# Altium footprint library _components.PcbLib: 53 footprints (part 3 of 4)
Each footprint in its own frame and in the unit in brackets; x right, y up, seen from the top. Pads: shape width x height; smd on the part's side, far side on the other; paste and mask are expansions set on the pad; w line width, h text height; cw(c..) or ccw(c..) is an arc to the next point about the centre after c.
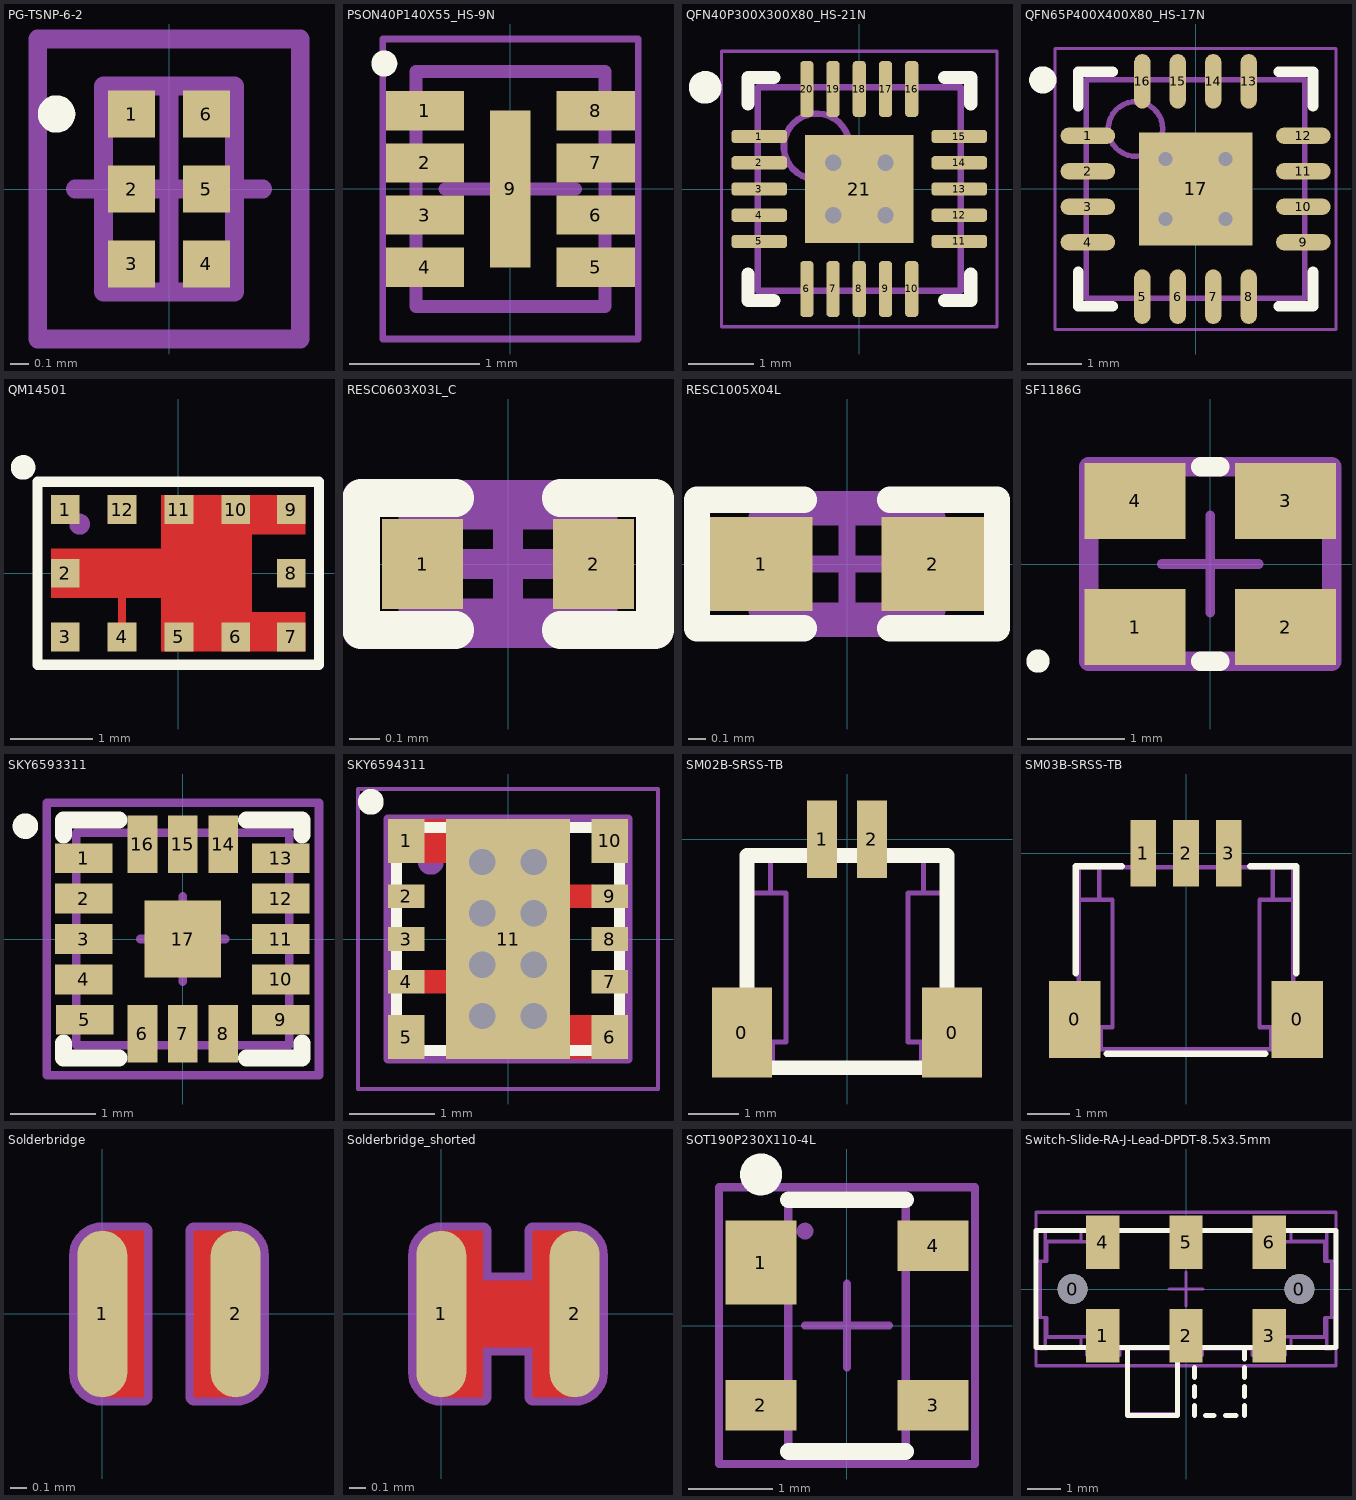
[diagram p2: the footprints below, top view; thin cyan lines are the x and y axes]

## PG-TSNP-6-2 [mm] "TSNP-6-2 ,0.40mm Pitch, 6 Pin, 0.7mm W X 1.1mm L X 0.4mm H body"
height 0.4
pads (6):
  rect 0.25x0.25 smd: 1(-0.2,0.4) 2(-0.2,0) 3(-0.2,-0.4) 4(0.2,-0.4) 5(0.2,0) 6(0.2,0.4)
Top Overlay:
  circle w0.1: c-0.6,0.4 r0.05
Top Assembly Info:
  lines w0.1: -0.35,-0.55 0.35,-0.55 0.35,0.55 -0.35,0.55 -0.35,-0.55
Top Placement:
  lines w0.1: -0.5,0 0.5,0 ; 0,-0.5 0,0.5 ; -0.7,-0.8 0.7,-0.8 0.7,0.8 -0.7,0.8 -0.7,-0.8
3D body "PG-TSNP-6-2_C66065-A0004-C013-04-0004.stp": height 0.4, standoff 0, extent -0.35,-0.55 0.35,0.55

## PSON40P140X55_HS-9N [mm] "PSON, 8-Leads, Body 1,70x1,35mm, Pitch 0,40mm, Thermal Pad 1,20x0,31mm, IPC Medium Density"
height 0.55
pads (9):
  rect 0.6x0.3 smd: 1(-0.655,0.6) 2(-0.655,0.2) 3(-0.655,-0.2) 4(-0.655,-0.6) 5(0.655,-0.6) 6(0.655,-0.2) 7(0.655,0.2) 8(0.655,0.6)
  rect 0.31x1.2 smd: 9(0,0)
Top Overlay:
  circle w0.1: c-0.967,0.962 r0.05
Top Assembly Info:
  lines w0.1: -0.725,-0.9 0.725,-0.9 0.725,0.9 -0.725,0.9 -0.725,-0.9
  text ".Designator" at -0.381,-0.254 h0.5
Top Placement:
  lines w0.05: -0.98,-1.15 -0.98,1.15 0.98,1.15 0.98,-1.15 -0.98,-1.15
  lines w0.1: -0.5,0 0.5,0 ; 0,-0.5 0,0.5
3D body "PSON40P140X55_HS-9N.step": height 0.55, standoff 0, extent -0.726,-0.9 0.726,0.9

## QFN40P300X300X80_HS-21N [mm] "QFN, 20-Leads, Body 3,00x3,00mm, Pitch 0,40mm, Thermal Pad 1,65x1,65mm, IPC Medium Density"
height 0.8
pads (21):
  rrect50% 0.85x0.2 smd: 1(-1.525,0.8) 2(-1.525,0.4) 3(-1.525,0) 4(-1.525,-0.4) 5(-1.525,-0.8) 11(1.525,-0.8) 12(1.525,-0.4) 13(1.525,0) 14(1.525,0.4) 15(1.525,0.8)
  rrect50% 0.2x0.85 smd: 6(-0.8,-1.525) 7(-0.4,-1.525) 8(0,-1.525) 9(0.4,-1.525) 10(0.8,-1.525) 16(0.8,1.525) 17(0.4,1.525) 18(0,1.525) 19(-0.4,1.525) 20(-0.8,1.525)
  rect 1.65x1.65 smd: 21(0,0)
via -0.4,0.4 diameter 0.5 hole 0.25
via 0.4,0.4 diameter 0.5 hole 0.25
via 0.4,-0.4 diameter 0.5 hole 0.25
via -0.4,-0.4 diameter 0.5 hole 0.25
Top Overlay:
  circle w0.25: c-2.35,1.55 r0.125
  lines w0.2: -1.7,-1.3 -1.7,-1.7 -1.3,-1.7 ; -1.7,1.3 -1.7,1.7 -1.3,1.7 ; 1.3,-1.7 1.7,-1.7 1.7,-1.3 ; 1.3,1.7 1.7,1.7 1.7,1.3
Top Assembly Info:
  circle w0.1: c-0.65,0.65 r0.5
  lines w0.1: -1.55,-1.55 -1.55,1.55 1.55,1.55 1.55,-1.55 -1.55,-1.55
  text ".Designator" at -0.275,-0.175 h0.38
Top Placement:
  lines w0.05: -2.1,-2.1 -2.1,2.1 2.1,2.1 2.1,-2.1 -2.1,-2.1
  lines w0.1: -0.5,0 0.5,0 ; 0,-0.5 0,0.5
3D body "QFN40P300X300X80_HS-21N.step": height 0.8, standoff 0, extent -1.551,-1.551 1.551,1.551

## QFN65P400X400X80_HS-17N [mm] "QFN, 16-Leads, Body 4,00x4,00mm, Pitch 0,65mm, Thermal Pad 2,08x2,08mm, IPC Medium Density"
height 0.8
pads (17):
  oval 1x0.3 smd: 1(-1.975,0.975) 2(-1.975,0.325) 3(-1.975,-0.325) 4(-1.975,-0.975) 9(1.975,-0.975) 10(1.975,-0.325) 11(1.975,0.325) 12(1.975,0.975)
  oval 0.3x1 smd: 5(-0.975,-1.975) 6(-0.325,-1.975) 7(0.325,-1.975) 8(0.975,-1.975) 13(0.975,1.975) 14(0.325,1.975) 15(-0.325,1.975) 16(-0.975,1.975)
  rect 2.08x2.08 smd: 17(0,0)
via -0.55,0.55 diameter 0.5 hole 0.25
via 0.55,0.55 diameter 0.5 hole 0.25
via -0.55,-0.55 diameter 0.5 hole 0.25
via 0.55,-0.55 diameter 0.5 hole 0.25
Top Overlay:
  circle w0.25: c-2.8,2 r0.125
  lines w0.2: -2.15,-1.525 -2.15,-2.15 -1.525,-2.15 ; -2.15,1.525 -2.15,2.15 -1.525,2.15 ; 1.525,-2.15 2.15,-2.15 2.15,-1.525 ; 1.525,2.15 2.15,2.15 2.15,1.525
Top Assembly Info:
  circle w0.1: c-1.1,1.1 r0.5
  lines w0.1: -2,-2 -2,2 2,2 2,-2 -2,-2
Top Placement:
  lines w0.05: -2.575,-2.575 -2.575,2.575 2.575,2.575 2.575,-2.575 -2.575,-2.575
  lines w0.1: -0.5,0 0.5,0 ; 0,-0.5 0,0.5
3D body "QFN65P400X400X80_HS-17N.step": height 0.8, standoff 0, extent -2.001,-2.001 2.001,2.001

## QM14501 [mm]
pads (12):
  rect 0.35x0.35 smd mask+0.065: 1(-1.375,0.775) 2(-1.375,0) 3(-1.375,-0.775) 4(-0.683,-0.775) 5(0.009,-0.775) 6(0.701,-0.775) 7(1.375,-0.775) 8(1.375,0) 9(1.375,0.775) 10(0.701,0.775) 11(0.009,0.775) 12(-0.683,0.775)
Top Layer:
  rectangle: -0.208,-0.6 0.9,0.6
  rectangle: -0.208,0.474 1.55,0.95
  rectangle: -0.733,-0.775 -0.633,-0.15
  rectangle: -1.551,-0.3 -0.151,0.3
  rectangle: -0.208,-0.95 1.55,-0.474
Top Overlay:
  circle w0.2: c-1.888,1.288 r0.05
  lines w0.125: -1.713,-1.112 -1.713,1.112 1.712,1.112 1.712,-1.112 -1.713,-1.112
Top Solder:
  rectangle: -0.273,0.365 1.615,1.015
  rectangle: -0.798,-0.775 -0.568,-0.3
  rectangle: -1.615,-0.366 0.965,0.364
  rectangle: -0.273,-1.015 1.615,-0.365
  rectangle: -0.272,-0.6 0.966,0.6
Top Component Info:
  text ".Comment" at -0.9,-0.15 h0.3
Top Assembly Info:
  circle w0.15: c-1.2,0.6 r0.05
  lines w0.01: -1.7,-1.1 1.7,-1.1 1.7,1.1 -1.7,1.1 -1.7,-1.1
  text ".Designator" at -0.45,-0.15 h0.3
Top Placement:
  circle w0.15: c-1.2,0.595 r0.05
  lines w0.01: -1.7,-1.1 1.7,-1.1 1.7,1.1 -1.7,1.1 -1.7,-1.1
3D body: height 1, standoff 0, extent -1.7,-1.1 1.7,1.1
3D body: height 1.01, standoff 1, extent -1.349,0.45 -1.05,0.75

## RESC0603X03L_C [mm]
pads (2):
  rect 0.27x0.3 smd: 1(-0.285,0) 2(0.285,0)
Top Overlay:
  lines w0.125: -0.175,-0.22 -0.49,-0.22 -0.49,0.22 -0.175,0.22 ; 0.175,-0.22 0.49,-0.22 0.49,0.22 0.175,0.22
Top Assembly Info:
  lines w0.1: -0.315,-0.165 -0.315,0.165 0.315,0.165 0.315,-0.165 -0.315,-0.165
  text ".Designator" at -0.306,0.268 h0.3
Top Placement:
  lines w0.1: -0.165,0 0.165,0 ; 0,-0.165 0,0.165 ; -0.5,-0.23 -0.5,0.23 0.5,0.23 0.5,-0.23 -0.5,-0.23
3D body "User Library-res0201-1.step": height 0.23, standoff 0, extent -0.3,-0.15 0.3,0.15

## RESC1005X04L [mm]
pads (2):
  rect 0.6x0.55 smd: 1(-0.5,0) 2(0.5,0)
Top Overlay:
  lines w0.152: -0.25,-0.375 -0.875,-0.375 -0.875,0.375 -0.25,0.375 ; 0.25,-0.375 0.875,-0.375 0.875,0.375 0.25,0.375
Top Assembly Info:
  lines w0.1: -0.525,-0.275 0.525,-0.275 0.525,0.275 -0.525,0.275 -0.525,-0.275
  text ".Designator" at -0.432,-0.152 h0.3
Top Placement:
  lines w0.1: -0.275,0 0.275,0 ; 0,-0.275 0,0.275 ; -0.875,-0.375 -0.875,0.375 0.875,0.375 0.875,-0.375 -0.875,-0.375
3D body "User Library-res0402-1.step": height 0.3, standoff 0, extent -0.5,-0.25 0.5,0.25

## SF1186G [mm]
pads (4):
  rect 1.04x0.78 smd: 1(-0.775,-0.65) 2(0.775,-0.65) 3(0.775,0.65) 4(-0.775,0.65)
Top Overlay:
  circle w0.2: c-1.775,-1 r0.02
  lines w0.2: -0.1,-1 0.1,-1 ; -0.1,1 0.1,1
Top Assembly Info:
  lines w0.2: -1.25,-1 -1.25,1 1.25,1 1.25,-1 -1.25,-1
  text ".Designator" at -0.432,-0.152 h0.3
Top Placement:
  lines w0.1: -0.5,0 0.5,0 ; 0,-0.5 0,0.5
3D body: height 1, standoff 0, extent -1.25,-1 1.25,1.025

## SKY6593311 [mm]
pads (17):
  rect 0.675x0.35 smd: 1(-1.162,0.95) 2(-1.162,0.475) 3(-1.162,0) 4(-1.162,-0.475) 5(-1.15,-0.95) 10(1.15,-0.475) 11(1.15,0) 12(1.15,0.475) 13(1.15,0.95)
  rect 0.35x0.675 smd: 6(-0.475,-1.112) 7(0,-1.112) 8(0.475,-1.112) 14(0.475,1.112) 15(0,1.112) 16(-0.475,1.112)
  rect 0.678x0.35 smd: 9(1.15,-0.95)
  rect 0.9x0.9 smd: 17(0,0)
Top Overlay:
  circle w0.15: c-1.85,1.325 r0.075
  lines w0.2: -1.4,-1.225 -1.4,-1.4 -0.75,-1.4 ; -1.4,1.225 -1.4,1.4 -0.75,1.4 ; 0.75,-1.4 1.4,-1.4 1.4,-1.225 ; 0.75,1.4 1.4,1.4 1.4,1.225
Top Assembly Info:
  lines w0.1: -1.25,-1.25 -1.25,1.25 1.25,1.25 1.25,-1.25 -1.25,-1.25
  text ".Designator" at -0.25,-0.175 h0.38
Top Placement:
  lines w0.1: -0.5,0 0.5,0 ; 0,-0.5 0,0.5 ; -1.6,-1.6 -1.6,1.6 1.6,1.6 1.6,-1.6 -1.6,-1.6
3D body "SKY65933-11.stp": height 0.9, standoff 0, extent -1.25,-1.25 1.25,1.25

## SKY6594311 [mm]
pads (12):
  rect 0.425x0.515 smd mask+0.05: 1(-1.188,1.144) 5(-1.188,-1.144) 6(1.188,-1.144) 10(1.188,1.144)
  rect 0.425x0.275 smd mask+0.05: 2(-1.188,0.5) 3(-1.188,0) 4(-1.188,-0.5) 7(1.188,-0.5) 8(1.188,0) 9(1.188,0.5)
  rect 1.45x2.802 smd paste-2 mask-5: 11(0,0)
  rect 1.55x2.487 on Top Solder: ""(0,0)
via -0.3,0.3 diameter 0.61 hole 0.305
via 0.3,0.3 diameter 0.61 hole 0.305
via 0.3,0.9 diameter 0.61 hole 0.305
via -0.3,0.9 diameter 0.61 hole 0.305
via -0.3,-0.3 diameter 0.61 hole 0.305
via 0.3,-0.3 diameter 0.61 hole 0.305
via 0.3,-0.9 diameter 0.61 hole 0.305
via -0.3,-0.9 diameter 0.61 hole 0.305
Top Layer:
  region: -0.712,-0.362 -0.987,-0.362 -0.987,-0.637 -0.712,-0.637
  rectangle: 0.712,0.363 0.987,0.637
  rectangle: 0.711,-1.4 0.986,-0.887
  rectangle: -0.989,0.887 -0.714,1.4
Top Overlay:
  circle w0.2: c-1.6,1.6 r0.05
  lines w0.125: -1.3,-1.3 -1.3,1.3 1.3,1.3 1.3,-1.3 -1.3,-1.3
Top Paste:
  rectangle: -0.774,0.498 0.776,1.243
  rectangle: -0.775,-0.334 0.775,0.336
  rectangle: -0.774,-1.243 0.776,-0.498
Top Assembly Info:
  circle w0.2: c-0.9,0.9 r0.05
  lines w0.1: -1.4,-1.4 1.4,-1.4 1.4,1.4 -1.4,1.4 -1.4,-1.4
  text ".Designator" at -0.45,-0.15 h0.3
Top Placement:
  lines w0.05: -0.5,0 0.5,0 ; 0,-0.5 0,0.5 ; -1.75,-1.75 -1.75,1.75 1.75,1.75 1.75,-1.75 -1.75,-1.75
3D body: height 0.7, standoff 0, extent -1.25,-1.25 1.25,1.25
3D body: height 0.71, standoff 0.7, extent -1.049,0.75 -0.75,1.05

## SM02B-SRSS-TB [mm]
pads (4):
  rect 1.2x1.8 smd: 0(-2.1,-3.875) 0(2.1,-3.875)
  rect 0.6x1.55 smd: 1(-0.5,0) 2(0.5,0)
Top Overlay:
  lines w0.3: -2,-4.575 -2,-0.325 2,-0.325 2,-4.575 -2,-4.575
Top Assembly Info:
  lines w0.1: -2,-1.084 -1.527,-1.084 ; -1.527,-0.325 -1.527,-1.084 ; -1.489,-4.575 -1.489,-4.058 -1.216,-4.058 -1.216,-1.084 -1.527,-1.084 ; -0.652,-0.325 -0.652,0.164 cw(c-0.502,0.164) -0.352,0.164 -0.352,-0.325 ; 0.347,-0.325 0.347,0.164 cw(c0.497,0.164) 0.647,0.164 0.647,-0.325 ; 1.489,-4.575 1.489,-4.058 1.216,-4.058 1.216,-1.084 1.527,-1.084 ; 1.527,-0.325 1.527,-1.084 ; 2,-1.084 1.527,-1.084 ; -2,-4.575 -2,-0.325 2,-0.325 2,-4.575 -2,-4.575
  text ".Designator" at -0.5,-2.5 h0.38
3D body "JST_SM02B-SRSS-TB.step": height 3, standoff 0, extent -1.994,-4.575 1.994,0.412

## SM03B-SRSS-TB [mm]
pads (5):
  rect 1.2x1.8 smd: 0(-2.6,-3.875) 0(2.6,-3.875)
  rect 0.6x1.55 smd: 1(-1,0) 2(0,0) 3(1,0)
Top Overlay:
  lines w0.15: -2.575,-2.8 -2.575,-0.3 -1.5,-0.3 ; -1.85,-4.681 1.85,-4.681 ; 1.5,-0.3 2.575,-0.3 2.575,-2.8
Top Assembly Info:
  lines w0.1: -2.5,-1.084 -2.027,-1.084 ; -2.027,-0.325 -2.027,-1.084 ; -1.989,-4.575 -1.989,-4.058 -1.716,-4.058 -1.716,-1.084 -2.027,-1.084 ; -1.152,-0.325 -1.152,0.164 cw(c-1.002,0.164) -0.852,0.164 -0.852,-0.325 ; -0.153,-0.325 -0.153,0.164 cw(c-0.003,0.164) 0.147,0.164 0.147,-0.325 ; 0.847,-0.325 0.847,0.164 cw(c0.997,0.164) 1.147,0.164 1.147,-0.325 ; 1.989,-4.575 1.989,-4.058 1.716,-4.058 1.716,-1.084 2.027,-1.084 ; 2.5,-1.084 2.027,-1.084 ; 2.027,-1.084 2.027,-0.325 ; 2.027,-0.325 -2.5,-0.325 -2.5,-4.575 2.5,-4.575 2.5,-0.325 2.027,-0.325
  text ".Designator" at -1,-2.5 h0.38
3D body "SM03B-SRSS-TB.STEP": height 2.95, standoff -0.01, extent -2.5,-4.606 2.5,0.344

## Solderbridge [mm]
pads (2):
  oval 0.3x1 smd mask+0.075: 1(0,0) 2(0.8,0)
Top Layer:
  region: 0,0.5 0.25,0.5 0.25,-0.5 0,-0.5
  region: 0.8,-0.5 0.55,-0.5 0.55,0.5 0.8,0.5
Top Assembly Info:
  lines w0.1: 0.55,0.2 0.55,0.5 0.8,0.5 cw(c0.8,0.35) 0.95,0.35 0.95,-0.35 cw(c0.8,-0.35) 0.8,-0.5 0.55,-0.5 0.55,0.225 ; -0.15,-0.35 ccw(c0,-0.35) 0,-0.5 0.25,-0.5 0.25,0.2 0.25,0.5 0,0.5 ccw(c0,0.35) -0.15,0.35 -0.15,-0.35
  text ".Designator" at -0.175,0.7 h0.38

## Solderbridge_shorted [mm]
pads (2):
  oval 0.3x1 smd mask+0.075: 1(0,0) 2(0.8,0)
Top Layer:
  rectangle: 0.2,-0.2 0.6,0.2
  region: 0.8,-0.5 0.55,-0.5 0.55,0.5 0.8,0.5
  region: 0,0.5 0.25,0.5 0.25,-0.5 0,-0.5
Top Assembly Info:
  lines w0.1: -0.15,-0.35 ccw(c0,-0.35) 0,-0.5 0.25,-0.5 0.25,-0.2 0.55,-0.2 0.55,-0.5 0.8,-0.5 ccw(c0.8,-0.35) 0.95,-0.35 0.95,0.35 ccw(c0.8,0.35) 0.8,0.5 0.55,0.5 0.55,0.2 0.25,0.2 0.25,0.5 0,0.5 ccw(c0,0.35) -0.15,0.35 -0.15,-0.35
  text ".Designator" at -0.175,0.7 h0.38

## SOT190P230X110-4L [mm]
pads (4):
  rect 0.85x1 smd: 1(-1.025,0.75)
  rect 0.85x0.6 smd: 2(-1.025,-0.95) 3(1.025,-0.95) 4(1.025,0.95)
Top Overlay:
  circle w0.25: c-1.025,1.8 r0.125
  lines w0.2: -0.7,-1.5 0.7,-1.5 ; -0.7,1.5 0.7,1.5
Top Assembly Info:
  circle w0.1: c-0.5,1.125 r0.05
  lines w0.1: -0.7,-1.5 -0.7,1.5 0.7,1.5 0.7,-1.5 -0.7,-1.5
  text ".Designator" at -0.225,1.375 h0.69
Top Placement:
  lines w0.1: -0.5,0 0.5,0 ; 0,-0.5 0,0.5 ; -1.525,-1.65 -1.525,1.65 1.525,1.65 1.525,-1.65 -1.525,-1.65
3D body "User Library-sot143.step": height 1, standoff 0, extent -1.21,-1.46 1.21,1.46

## Switch-Slide-RA-J-Lead-DPDT-8.5x3.5mm [mm]
pads (8):
  round 0.9 hole 0.9 unplated mask+0: 0(-3.4,0) 0(3.4,0)
  rect 1x1.6 smd: 1(-2.5,-1.4) 2(0,-1.4) 3(2.5,-1.4) 4(-2.5,1.4) 5(0,1.4) 6(2.5,1.4)
Top Overlay:
  lines w0.152: -1.75,-1.75 -1.75,-3.8 -0.25,-3.8 -0.25,-1.75 ; 0.25,-3.8 0.25,-3.5 ; 0.25,-3.22 0.25,-2.92 ; 0.25,-2.66 0.25,-2.36 ; 0.25,-2.1 0.25,-1.75 ; 0.59,-3.8 0.84,-3.8 ; 1.19,-3.8 1.44,-3.8 ; 1.2,-3.8 1.5,-3.8 ; 1.75,-3.8 1.75,-3.5 ; 1.75,-3.22 1.75,-2.92 ; 1.75,-2.66 1.75,-2.36 ; 1.75,-2.1 1.75,-1.75 ; -4.5,-1.75 -4.5,1.75 4.5,1.75 4.5,-1.75 -4.5,-1.75
Top Assembly Info:
  lines w0.1: -4.376,-1.747 -4.376,-1.797 -4.174,-1.797 -4.174,-1.747 ; -4.376,1.731 -4.376,1.781 -4.174,1.781 -4.174,1.731 ; -4.224,-1.747 -4.224,-0.853 ; -4.224,-1.449 -3.151,-1.449 -3.151,-1.747 ; -4.224,0.836 -4.224,1.731 ; -4.224,1.433 -3.151,1.433 -3.151,1.731 ; -2.982,-1.747 -2.982,-1.996 -1.988,-1.996 -1.988,-1.797 ; -2.783,-1.747 -2.783,-1.797 -2.772,-1.797 ; -2.783,1.731 -2.783,1.781 -2.772,1.781 ; -2.772,-1.747 -4.472,-1.747 -4.472,-0.853 -4.376,-0.853 ; -2.772,1.731 -4.472,1.731 -4.472,0.836 -4.376,0.836 ; -1.74,-1.797 -1.74,-3.735 -0.249,-3.735 -0.249,-1.797 ; -0.249,-1.996 0.496,-1.996 0.496,-1.797 ; 1.987,-1.797 1.987,-1.996 2.981,-1.996 2.981,-1.747 ; 2.77,-1.747 4.471,-1.747 4.471,-0.853 4.375,-0.853 ; 2.77,1.731 4.471,1.731 4.471,0.836 4.375,0.836 ; 2.782,-1.747 2.782,-1.797 2.77,-1.797 ; 2.782,1.731 2.782,1.781 2.77,1.781 ; 3.149,-1.747 3.149,-1.449 4.223,-1.449 ; 3.149,1.731 3.149,1.433 4.223,1.433 ; 4.173,-1.747 4.173,-1.797 4.375,-1.797 4.375,-1.747 ; 4.173,1.731 4.173,1.781 4.375,1.781 4.375,1.731 ; 4.223,-1.747 4.223,-0.853 ; 4.223,0.836 4.223,1.731 ; -4.376,-0.853 -4.376,0.836 ; -4.376,-0.853 -4.168,-0.853 -4.168,-1.434 -2.772,-1.434 -2.772,-1.797 ; -4.376,0.836 -4.168,0.836 -4.168,1.418 -2.772,1.418 -2.772,1.781 ; -2.772,-1.797 2.77,-1.797 ; -2.772,1.781 2.77,1.781 ; 2.77,-1.797 2.77,-1.434 4.166,-1.434 4.166,-0.853 4.375,-0.853 ; 2.77,1.781 2.77,1.418 4.166,1.418 4.166,0.836 4.375,0.836 ; 4.375,-0.853 4.375,0.836
  text ".Designator" at -0.9,-0.2 h0.38
Top Placement:
  lines w0.1: -0.5,0 0.5,0 ; 0,-0.5 0,0.5 ; -4.5,-2.3 4.5,-2.3 4.5,2.3 -4.5,2.3 -4.5,-2.3
3D body "CL-SB-22A-11T.stp": height 3.5, standoff 0, extent -4.25,-3.75 4.25,1.75